# Altium integrated library Self made library.IntLib: 370 symbols (part 3 of 3)
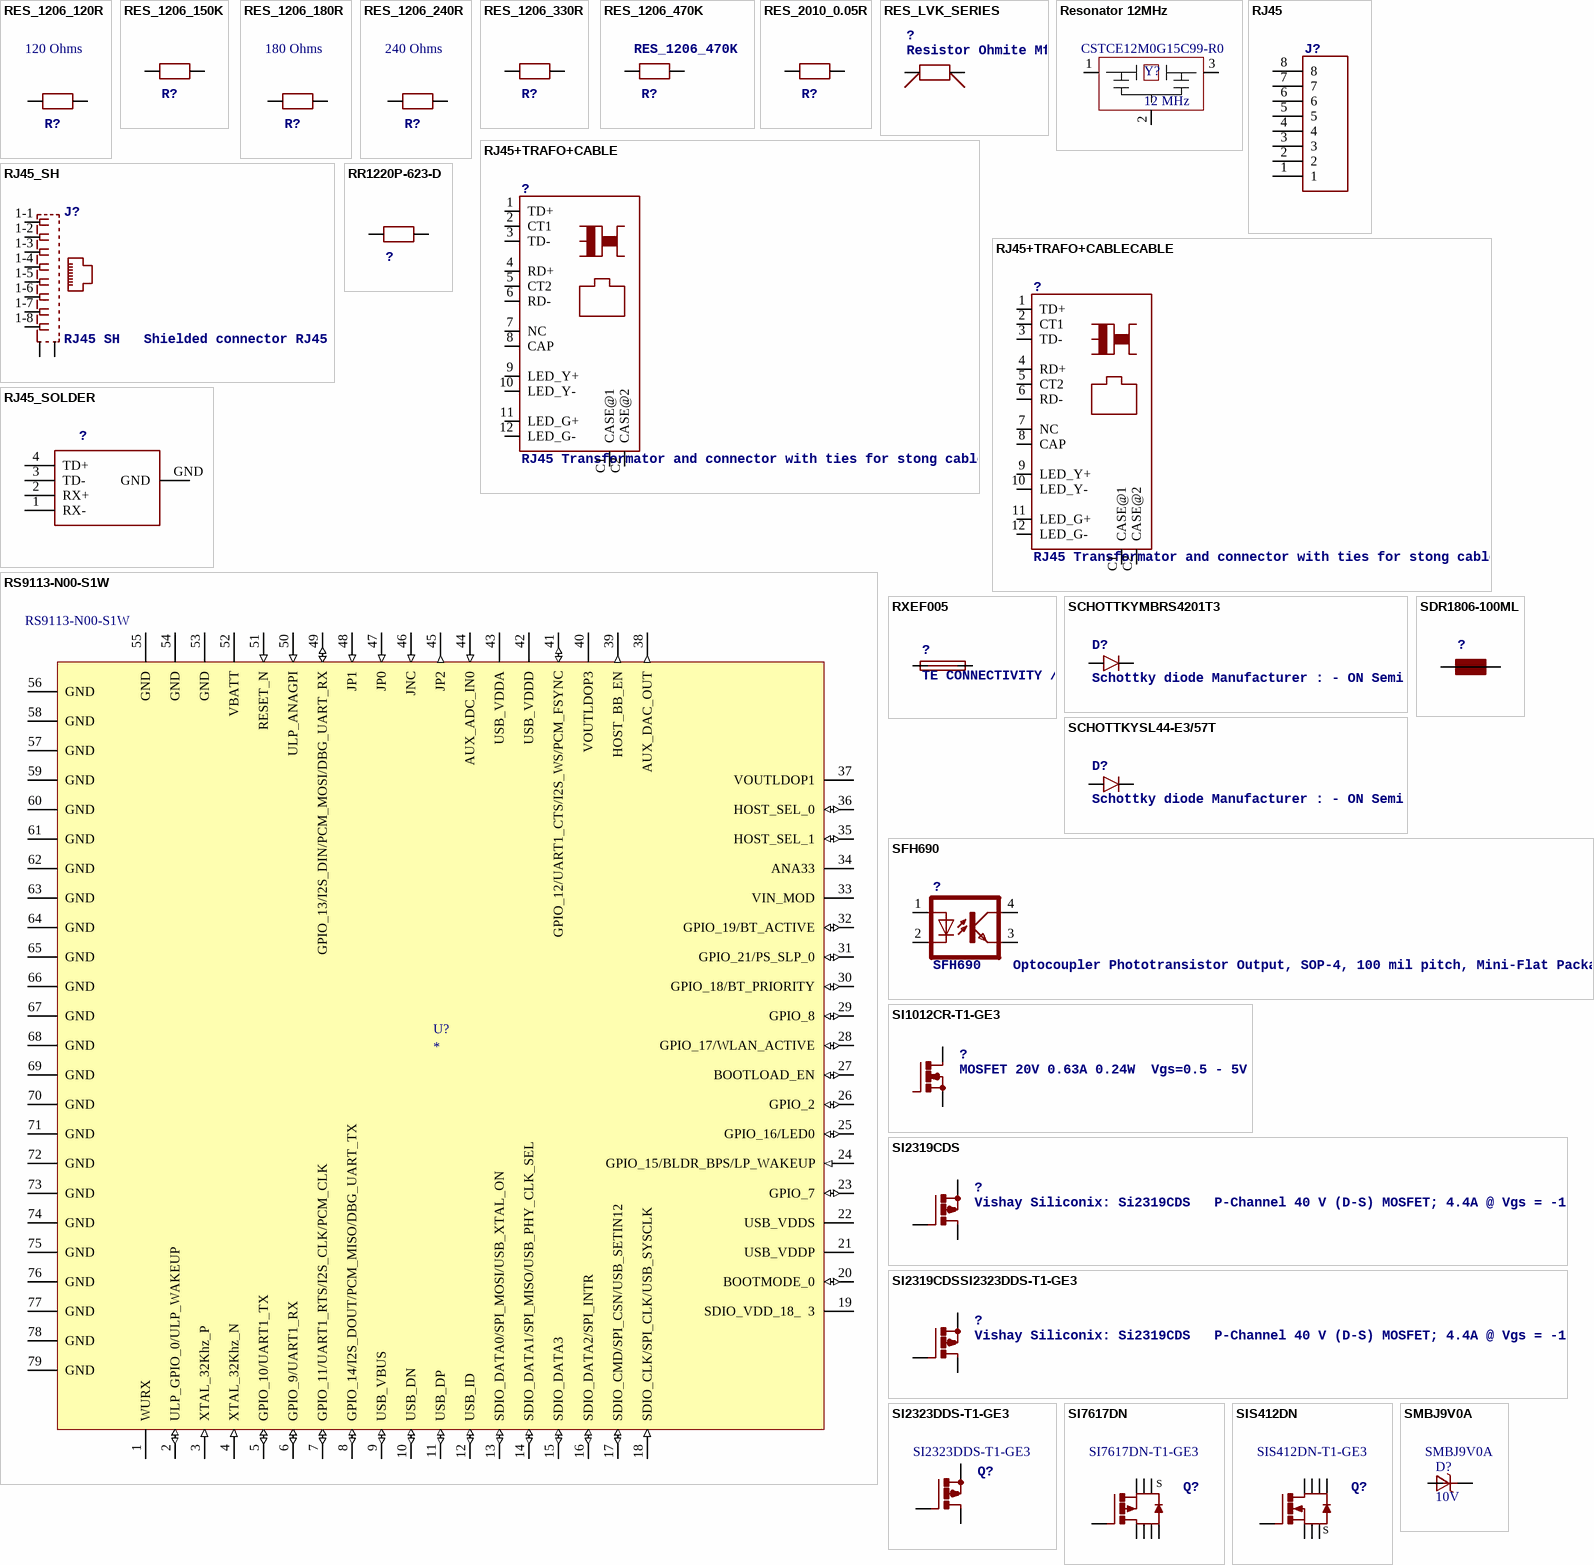
[diagram p22: symbols RES_1206_120R to SMBJ9V0A]

## Resonator 12MHz
designator Y?, comment 12 MHz  Manufacturer Part Number 1: CSTCE12M0G15C99-R0
Manufacturer 1: Murata Electronics; Description 1: Résonateurs 12MHZ; Capacité de charge: 33 pF; Plage de températures de fonctionnement: - 40 C to + 125 C; Conditionnement: Reel; Série: CST; Style du raccordement: SMD/SMT; Tolérance: 0.1 %; Fabricant: Murata; Catégorie du produit: Ceramic Resonators, SMD; Quantité standard du lot: 3000; Nom commercial: CERALOCK; Supplier 1: Mouser; Supplier Part Number 1: 81-CSTCE12M0G15C99R0; RoHS: RoHS Compliant; Category: Résonateurs; Stock 1: 1792; Pricing 1: 1=0.696, 10=0.468, 100=0.444, 1000=0.374, 3000=0.339, 24000=0.328 (CHF); Dimensions: 1.3 mm W x 3.2 mm L x 1.1 mm H; Fréquence: 12 MHz; Type: Small-cap Chip Type; Marque: Murata Electronics; RoHS - Mouser: Y; Minimum Order Quantity: 1; Reeling: True; ComponentLink1URL: http://www.mouser.com/ds/2/281/p16e-522700.pdf; ComponentLink1Description: http://www.mouser.com/ds/2/281/p16e-522700.pdf
footprint CSTCE_G15C
pins: 1, 2, 3

## RJ45
designator J?
footprint RJ45_AMP_215877
pins: 1, 2, 3, 4, 5, 6, 7, 8

## RJ45+TRAFO+CABLE
designator ?, comment RJ45 Transformator and connector with ties for stong cable
footprint RJ45_HPLE_WE
pins: 1 TD+, 2 CT1, 3 TD-, 4 RD+, 5 CT2, 6 RD-, 7 NC, 8 CAP, 9 LED_Y+, 10 LED_Y-, 11 LED_G+, 12 LED_G-, C1 CASE@1, C2 CASE@2

## RJ45+TRAFO+CABLECABLE
designator ?, comment RJ45 Transformator and connector with ties for stong cable
footprint RJ45_LAN_HPLE_WE
pins: 1 TD+, 2 CT1, 3 TD-, 4 RD+, 5 CT2, 6 RD-, 7 NC, 8 CAP, 9 LED_Y+, 10 LED_Y-, 11 LED_G+, 12 LED_G-, C1 CASE@1, C2 CASE@2

## RJ45_SH
designator J?, comment RJ45 SH   Shielded connector RJ45
footprint CON_RJ45_SH
pins: 1-1 1, 1-2 2, 1-3 3, 1-4 4, 1-5 5, 1-6 6, 1-7 7, 1-8 8, G1 S1, G2 S2

## RJ45_SOLDER
designator ?
footprint USB_SOLDER
pins: 1 RX-, 2 RX+, 3 TD-, 4 TD+, GND

## RR1220P-623-D
designator ?
footprint 0805
pins: 1, 2

## RS9113-N00-S1W
designator U?  Manufacturer Part Number 1: RS9113-N00-S1W
Manufacturer 1: Redpine Signals; Description 1: Modules WiFi / 802.11 1band WiSeConnect Mod w/Ant and Wi-Fi; Conditionnement: Tray; Série: WiSeConnect; Product Status: New Product; Supplier 1: Mouser; Supplier Part Number 1: 980-RS9113-N00-S1W; RoHS: RoHS Compliant; Category: Modules WiFi / 802.11; Stock 1: 11; Pricing 1: 1=53.94, 10=50.49, 25=49.33, 50=47.36, 100=27.47 (CHF); Marque: Redpine Signals; Fabricant: Redpine Signals; RoHS - Mouser: Y; Minimum Order Quantity: 1; Reeling: False; ComponentLink1URL: http://www.mouser.com/ds/2/469/RS9113- WiSeConnectTM Module Family-335092.pdf; ComponentLink1Description: http://www.mouser.com/ds/2/469/RS9113- WiSeConnectTM Module Family-335092.pdf
footprint RS9113-N00-S1W
pins: 1 WURX, 2 ULP_GPIO_0/ULP_WAKEUP (io), 3 XTAL_32Khz_P (in), 4 XTAL_32Khz_N (in), 5 GPIO_10/UART1_TX (io), 6 GPIO_9/UART1_RX (io), 7 GPIO_11/UART1_RTS/I2S_CLK/PCM_CLK (io), 8 GPIO_14/I2S_DOUT/PCM_MISO/DBG_UART_TX (io), 9 USB_VBUS (io), 10 USB_DN (io), 11 USB_DP (io), 12 USB_ID (io), 13 SDIO_DATA0/SPI_MOSI/USB_XTAL_ON (io), 14 SDIO_DATA1/SPI_MISO/USB_PHY_CLK_SEL (io), 15 SDIO_DATA3 (io), 16 SDIO_DATA2/SPI_INTR (io), 17 SDIO_CMD/SPI_CSN/USB_SETIN12 (io), 18 SDIO_CLK/SPI_CLK/USB_SYSCLK (in), 19 SDIO_VDD_18_  3 (power), 20 BOOTMODE_0 (io), 21 USB_VDDP (power), 22 USB_VDDS (power), 23 GPIO_7 (io), 24 GPIO_15/BLDR_BPS/LP_WAKEUP (in), 25 GPIO_16/LED0 (io), 26 GPIO_2 (io), 27 BOOTLOAD_EN (io), 28 GPIO_17/WLAN_ACTIVE (io), 29 GPIO_8 (io), 30 GPIO_18/BT_PRIORITY (io), 31 GPIO_21/PS_SLP_0 (io), 32 GPIO_19/BT_ACTIVE (io), 33 VIN_MOD (power), 34 ANA33 (power), 35 HOST_SEL_1 (io), 36 HOST_SEL_0 (io), 37 VOUTLDOP1 (power), 38 AUX_DAC_OUT (out), 39 HOST_BB_EN (out), 40 VOUTLDOP3 (power), 41 GPIO_12/UART1_CTS/I2S_WS/PCM_FSYNC (io), 42 USB_VDDD (power), 43 USB_VDDA (power), 44 AUX_ADC_IN0 (in), 45 JP2 (out), 46 JNC (in), 47 JP0 (in), 48 JP1 (in), 49 GPIO_13/I2S_DIN/PCM_MOSI/DBG_UART_RX (io), 50 ULP_ANAGPI (in), 51 RESET_N (in), 52 VBATT (power), 53 GND (power), 54 GND (power), 55 GND (power), 56 GND (power), 57 GND (power), 58 GND (power), 59 GND (power), 60 GND (power), 61 GND (power), 62 GND (power), 63 GND (power), 64 GND (power), 65 GND (power), 66 GND (power), 67 GND (power), 68 GND (power), 69 GND (power), 70 GND (power), 71 GND (power), 72 GND (power), 73 GND (power), 74 GND (power), 75 GND (power), 76 GND (power), 77 GND (power), 78 GND (power), 79 GND (power)

## RXEF005
designator ?, comment TE CONNECTIVITY / RAYCHEM - RXEF005   Courant de maintien: 0.05A   Courant, déclenchement: 0.10A    Tension de fonctionnement: 60V
footprint RXEF_FIG5
pins: 1, 2

## SCHOTTKYMBRS4201T3
designator D?, comment Schottky diode Manufacturer : - ON Semi
footprint SMC_403-3
pins: A, C

## SCHOTTKYSL44-E3/57T
designator D?, comment Schottky diode Manufacturer : - ON Semi
footprint DO-214AB
pins: A, C

## SDR1806-100ML
designator ?
footprint SDR1806
pins: P$2 1, P$3 2

## SFH690
designator ?, comment SFH690    Optocoupler Phototransistor Output, SOP-4, 100 mil pitch, Mini-Flat Package
MANUFACTURER: Vishay Semiconductors; MANUFACTURER_PART_NUMBER: SFH690BT; UNIT_PRICE: 0.755; SUPPLIER: mouser; SUPPLIER_PART_NUMBER: 782-SFH690BT
footprint SOP04
pins: 1 A, 2 C, 3 EMIT, 4 COL

## SI1012CR-T1-GE3
designator ?, comment MOSFET 20V 0.63A 0.24W  Vgs=0.5 - 5V
MANUFACTURER: Vishay; MANUFACTURER_PART_NUMBER: SI1012CR-T1-GE3; UNIT_PRICE: 0.5; SUPPLIER: Mouser; SUPPLIER_PART_NUMBER: 78-SI1012CR-T1-GE3
footprint SOT-523-3
pins: 1 G, 2 S, 3 D

## SI2319CDS
designator ?, comment Vishay Siliconix: Si2319CDS   P-Channel 40 V (D-S) MOSFET; 4.4A @ Vgs = -10V
footprint SOT23
pins: 1 G, 2 S, 3 D

## SI2319CDSSI2323DDS-T1-GE3
designator ?, comment Vishay Siliconix: Si2319CDS   P-Channel 40 V (D-S) MOSFET; 4.4A @ Vgs = -10V
footprint SOT23
pins: 1 G, 2 S, 3 D

## SI2323DDS-T1-GE3
designator Q?, comment Manufacturer Part Number 1: SI2323DDS-T1-GE3  (hidden comment: MOSFET -20V 39mOhm@4.5V -5.3A P-Ch G-III)
MANUFACTURER: Vishay; Manufacturer 1: Vishay Semiconductors; UNIT_PRICE: 0.6; Configuration: Single; Package/Boîte: SOT-23-3; Conditionnement: Reel; Série: SI2323DDS; Transconductance directe - min.: 18 S; Style de montage: SMD/SMT; Polarité du transistor: P-Channel; Mode canal: Enhancement; Ciss - Capacité d'entrée: 1.16 nF; Temps de descente: 11 ns; Température de fonctionnement max.: + 150 C; Température de fonctionnement min.: - 55 C; Pd - Dissipation d’énergie: 1.7 W; Catégorie du produit: P-Channel MOSFETs; Qg - Charge de grille: 13.6 nC; Rds On - Résistance drain-source: 39 mOhms; Temps de montée: 22 ns; Quantité standard du lot: 3000; Nom commercial: TrenchFET  Power MOSFET; Délai de désactivation type: 52 ns; Vgs - Tension de rupture grille-source: 8 V; Vgs th - Tension de seuil grille-source: - 1 V; MANUFACTURER_PART_NUMBER: SI2323DDS-T1-GE3; SUPPLIER: Mouser; SUPPLIER_PART_NUMBER: 78-SI2323DDS-T1-GE3; Supplier 1: Mouser; Supplier Part Number 1: 78-SI2323DDS-T1-GE3; RoHS: RoHS Compliant; Description 1: MOSFET -20V 39mOhm@4.5V -5.3A P-Ch G-III; Category: MOSFET; Stock 1: 1212; Pricing 1: 1=0.570, 10=0.424, 100=0.315, 500=0.267, 1000=0.206, 3000=0.188, 6000=0.175, 9000=0.164, 24000=0.158 (CHF); Marque: Vishay Semiconductors; Id - Courant continu de fuite: - 5.3 A; Fabricant: Vishay; Vds - Tension de rupture drain-source: - 20 V; RoHS - Mouser: Y; Minimum Order Quantity: 1; Reeling: True; ComponentLink1URL: http://www.mouser.com/ds/2/427/si2323dds-254119.pdf; ComponentLink1Description: http://www.mouser.com/ds/2/427/si2323dds-254119.pdf
footprint SOT23
pins: 1 G, 2 S, 3 D

## SI7617DN
designator Q?  Manufacturer Part Number: SI7617DN-T1-GE3
Manufacturer: Vishay Semiconductors; Configuration: Single; Forward Transconductance - Min: 35 S; Transistor Polarity: P-Channel; Channel Mode: Enhancement; Fall Time: 11 ns; Id - Continuous Drain Current: - 35 A; Pd - Power Dissipation: 52 W; Qg - Gate Charge: 20.5 nC; Rds On - Drain-Source Resistance: 12.3 mOhms; Rise Time: 43 ns; Typical Turn-Off Delay Time: 30 ns; Vds - Drain-Source Breakdown Voltage: - 30 V; Vgs - Gate-Source Breakdown Voltage: 25 V; Supplier 1: Mouser; RoHS: RoHS Compliant By Exemption; Category: MOSFET; Stock 1: 18173; Pricing 1: 1=0.845, 10=0.678, 100=0.521, 500=0.461, 1000=0.363, 3000=0.339, 6000=0.328 (CHF); Package/Case: PowerPAK-1212-8; Packaging: Reel; Brand: Vishay Semiconductors; Mounting Style: SMD/SMT; Maximum Operating Temperature: + 150 C; Minimum Operating Temperature: - 55 C; Product Category: P-Channel MOSFETs; Standard Pack Qty: 3000; RoHS - Mouser: E; Minimum Order Quantity: 1; Reeling: True; ComponentLink1URL: http://www.mouser.com/ds/2/427/si7617dn-244516.pdf; ComponentLink1Description: http://www.mouser.com/ds/2/427/si7617dn-244516.pdf; Supplier Part Number 1: 781-SI7617DN-GE3
footprint PowerPAK 1212-8
pins: 1 S, 2 S, 3 S, 4 G, 5 D, 6 D, 7 D, 8 D

## SIS412DN
designator Q?  Manufacturer Part Number: SIS412DN-T1-GE3
Manufacturer: Vishay Semiconductors; Configuration: Single Quad Drain Triple Source; Forward Transconductance - Min: 17 S; Transistor Polarity: N-Channel; Channel Mode: Enhancement; Fall Time: 10 ns; Id - Continuous Drain Current: 12 A; Pd - Power Dissipation: 3.2 W; Rds On - Drain-Source Resistance: 24 mOhms; Rise Time: 12 ns; Typical Turn-Off Delay Time: 15 ns; Vds - Drain-Source Breakdown Voltage: 30 V; Vgs - Gate-Source Breakdown Voltage: 20 V; Product Status: New Technology; Supplier 1: Mouser; RoHS: RoHS Compliant; Category: MOSFET; Stock 1: 13270; Pricing 1: 1=0.561, 10=0.442, 100=0.335, 500=0.286, 1000=0.270, 3000=0.270 (CHF); Package/Case: PowerPAK-1212-8; Packaging: Reel; Series: SISxxxDN; Brand: Vishay Semiconductors; Mounting Style: SMD/SMT; Maximum Operating Temperature: + 150 C; Minimum Operating Temperature: - 55 C; Product Category: N-Channel MOSFETs; Standard Pack Qty: 3000; RoHS - Mouser: Y; Minimum Order Quantity: 1; Reeling: True; ComponentLink1URL: http://www.mouser.com/ds/2/427/sis412dn-280002.pdf; ComponentLink1Description: http://www.mouser.com/ds/2/427/sis412dn-280002.pdf; Supplier Part Number 1: 781-SIS412DN-T1-GE3
footprint PowerPAK 1212-8
pins: 1 S, 2 S, 3 S, 4 G, 5 D, 6 D, 7 D, 8 D

## SMBJ9V0A
designator D?, comment 10V  Manufacturer Part Number 1: SMBJ9V0A
Diodes TVS - Parasurtenseurs 9V 600W SMB Unidirectional; Manufacturer 1: Fairchild Semiconductor; Tension de rupture: 10 V to 11.1 V; Blocage de la tension: 15.4 V; Package/Boîte: DO-214AA; Conditionnement: Reel; Série: SMBJ9; Style du raccordement: SMD/SMT; Courant de surtension de pointe: 39 A; Température de fonctionnement max.: + 150 C; Température de fonctionnement min.: - 55 C; Quantité standard du lot: 3000; Supplier 1: Mouser; Supplier Part Number 1: 512-SMBJ9V0A; RoHS: RoHS Compliant By Exemption; Description 1: Diodes TVS - Parasurtenseurs 9V 600W SMB Unidirectional; Category: Diodes TVS - Parasurtenseurs; Stock 1: 4884; Pricing 1: 1=0.438, 10=0.293, 100=0.163, 1000=0.122, 3000=0.103, 9000=0.095, 24000=0.087, 45000=0.085 (CHF); Dimensions: 3.95(Max) mm W x 4.75 mm L; Tension de fonctionnement: 9 V; Marque: Fairchild Semiconductor; Style de montage: SMD/SMT; Fabricant: Fairchild Semiconductor; Dissipation de la puissance d'impulsion de crête: 600 W; Polarité: Unidirectional; RoHS - Mouser: E; Minimum Order Quantity: 1; Reeling: True; ComponentLink1URL: http://www.mouser.com/ds/2/149/SMBJ9V0A-196751.pdf; ComponentLink1Description: http://www.mouser.com/ds/2/149/SMBJ9V0A-196751.pdf
footprint DIODE_UNIDIR_SMB
pins: A, C

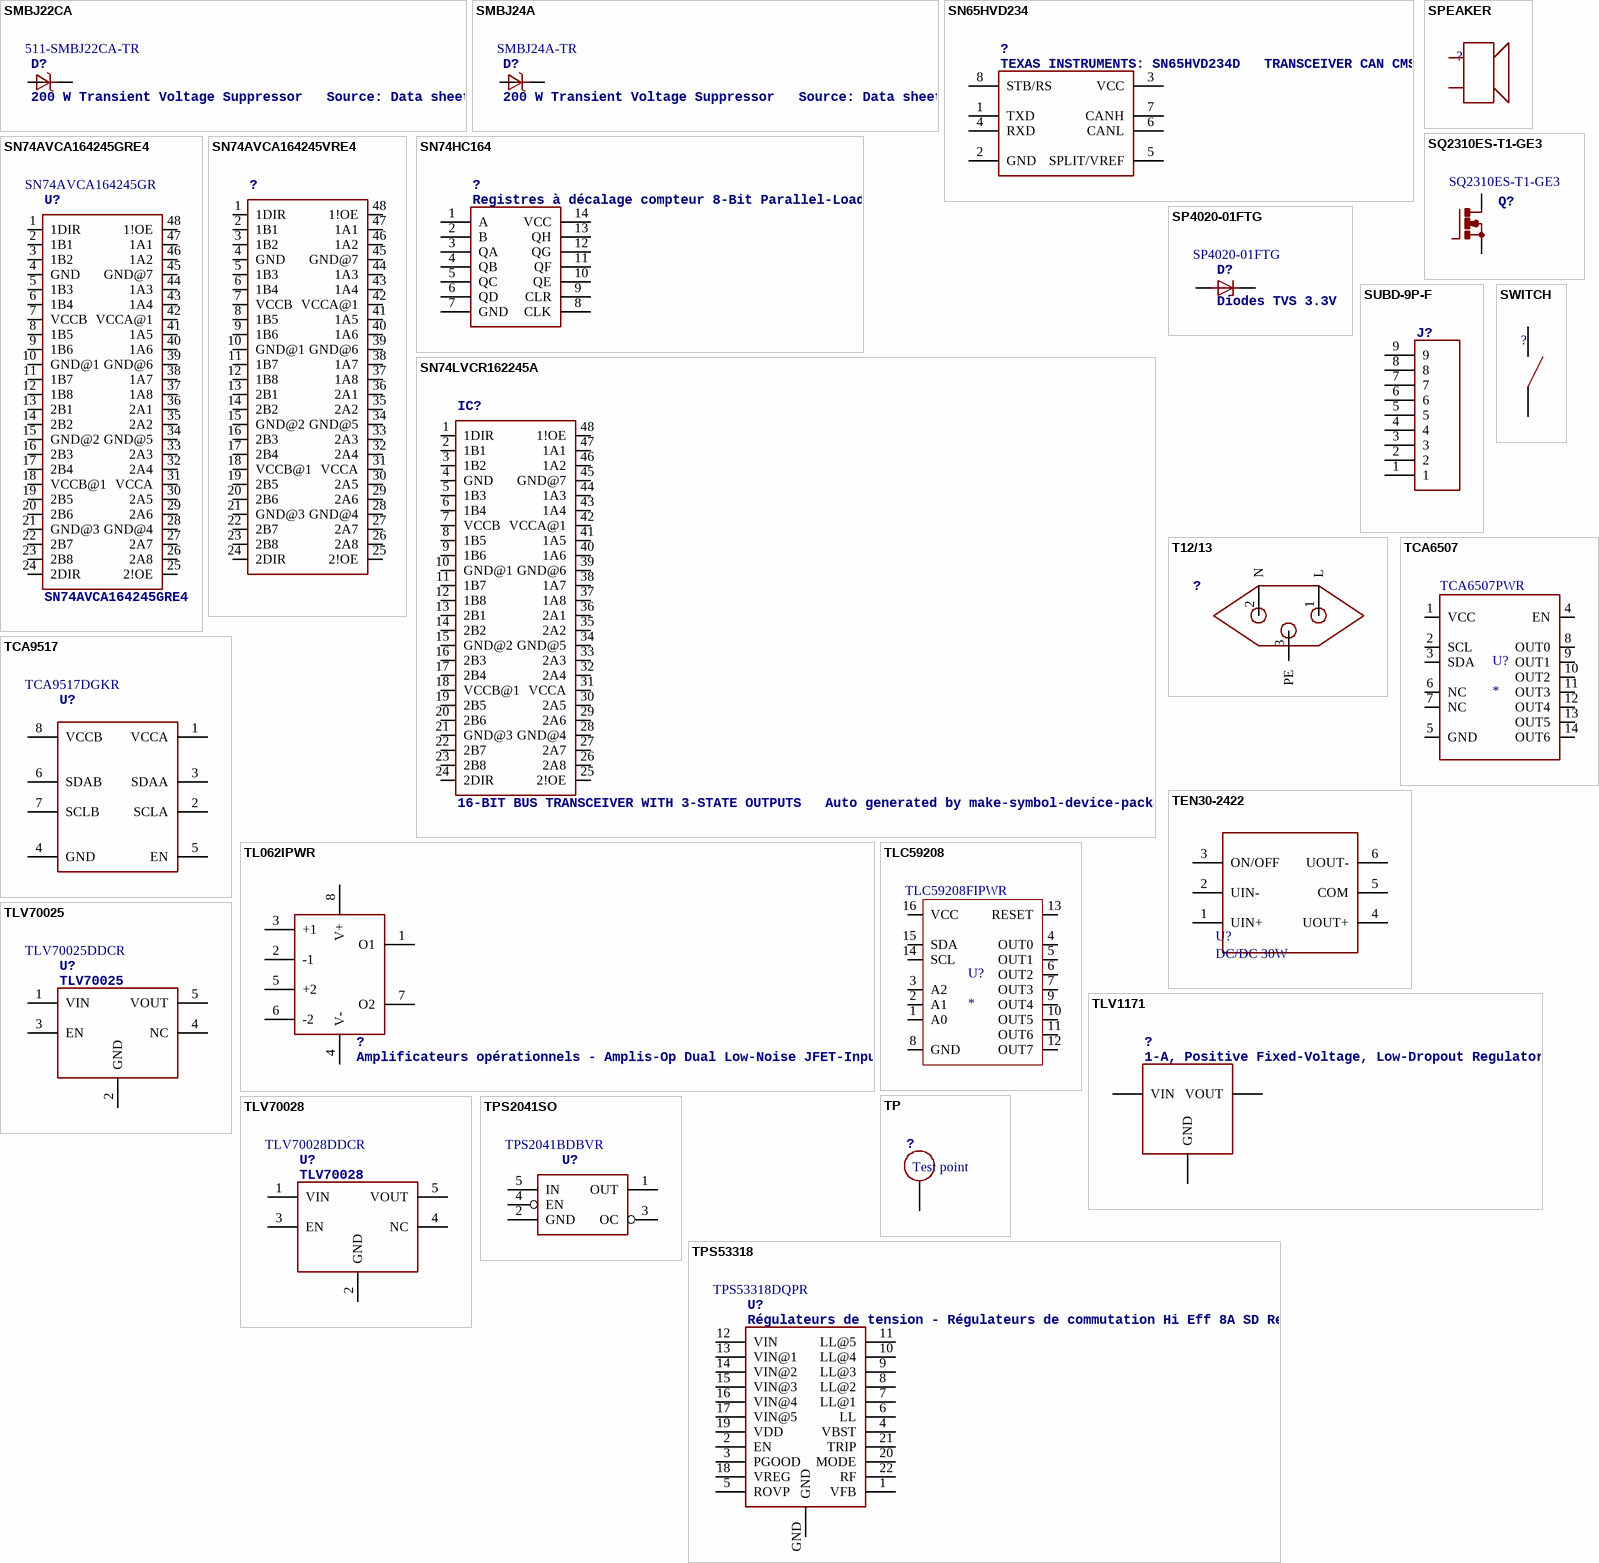
[diagram p17: symbols SMBJ22CA to TPS53318]

## SMBJ22CA
designator D?, comment 200 W Transient Voltage Suppressor   Source: Data sheet  Supplier Part Number 1: 511-SMBJ22CA-TR
Manufacturer: STMicroelectronics; Manufacturer Part Number: SMBJ22CA-TR; Description: TVS Diodes - Transient Voltage Suppressors TRANSIL PROTECTION; Breakdown Voltage: 24.4 V; Clamping Voltage: 48.3 V; Peak Surge Current: 17.7 A; Operating Supply Voltage: 22 V; Pd - Power Dissipation: 600 W; Polarity: Bidirectional; Supplier 1: Mouser; RoHS: RoHS Compliant; Category: TVS Diodes - Transient Voltage Suppressors; Stock 1: 2944; Pricing 1: 1=0.237, 10=0.163, 100=0.107, 1000=0.083, 2500=0.070, 10000=0.067, 25000=0.065 (CHF); Dimensions: 3.95 mm W x 4.6 mm L x 2.45 mm H; Package/Case: DO-214AA; Packaging: Reel; Series: SMBJ22; Termination Style: SMD/SMT; Brand: STMicroelectronics; Mounting Style: SMD/SMT; Maximum Operating Temperature: + 150 C; Minimum Operating Temperature: - 55 C; Product Category: Voltage Protection Devices; Standard Pack Qty: 2500; Tradename: Transil; RoHS - Mouser: Y; Minimum Order Quantity: 1; Reeling: True; ComponentLink1URL: http://www.mouser.com/ds/2/389/CD00001366-310691.pdf; ComponentLink1Description: http://www.mouser.com/ds/2/389/CD00001366-310691.pdf
footprint DIODE_UNIDIR_SMB
pins: A, C

## SMBJ24A
designator D?, comment 200 W Transient Voltage Suppressor   Source: Data sheet  Manufacturer Part Number 1: SMBJ24A-TR
Manufacturer 1: STMicroelectronics; Description 1: Diodes TVS - Parasurtenseurs 600W 24V Unidirect; Tension de rupture: 26.7 V to 29.5 V; Capacité électrique: 1112 pF; Blocage de la tension: 50 V; Tension de fonctionnement: 24 V; Package/Boîte: DO-214AA; Conditionnement: Reel; Série: SMBJ24; Style du raccordement: SMD/SMT; Courant de surtension de pointe: 16 A; Température de fonctionnement max.: + 150 C; Température de fonctionnement min.: - 55 C; Dissipation de la puissance d'impulsion de crête: 600 W; Polarité: Unidirectional; Catégorie du produit: Voltage Protection Devices; Quantité standard du lot: 2500; Nom commercial: Transil; Supplier 1: Mouser; Supplier Part Number 1: 511-SMBJ24A; RoHS: RoHS Compliant; Category: Diodes TVS - Parasurtenseurs; Stock 1: 0; Pricing 1: 1=0.228, 10=0.154, 100=0.102, 1000=0.079, 2500=0.066, 10000=0.064, 25000=0.062 (CHF); Dimensions: 3.95 mm W x 4.6 mm L x 2.45 mm H; Marque: STMicroelectronics; Style de montage: SMD/SMT; Fabricant: STMicroelectronics; RoHS - Mouser: Y; Minimum Order Quantity: 1; Reeling: True; ComponentLink1URL: http://www.mouser.com/ds/2/389/CD00001366-310691.pdf; ComponentLink1Description: http://www.mouser.com/ds/2/389/CD00001366-310691.pdf
footprint DIODE_UNIDIR_SMB
pins: A, C

## SN65HVD234
designator ?, comment TEXAS INSTRUMENTS: SN65HVD234D   TRANSCEIVER CAN CMS
footprint SOIC8
pins: 1 TXD, 2 GND, 3 VCC, 4 RXD, 5 SPLIT/VREF, 6 CANL, 7 CANH, 8 STB/RS

## SN74AVCA164245GRE4
designator U?  Manufacturer Part Number 1: SN74AVCA164245GR
MANUFACTURER: Texas Instruments; UNIT_PRICE: 4.01; Description 1: Translation - Niveaux de tension 16-Bit Dual-Supply Bus Xcvr; Débit de données: 400 Mb/s; Type de sortie: 3-State; Package/Boîte: TSSOP-48; Conditionnement: Reel; Style de montage: SMD/SMT; Température de fonctionnement max.: + 85 C; Température de fonctionnement min.: - 40 C; Catégorie du produit: Logic - Voltage Level Translation; Délai de propagation: 2.4 ns; Quantité standard du lot: 2000; Tension d’alimentation - Max.: 3.6 V; Tension d’alimentation - Min.: 1.4 V; MANUFACTURER_PART_NUMBER: SN74AVCA164245GR; SUPPLIER: Mouser; SUPPLIER_PART_NUMBER: 595-SN74AVCA164245GR; Supplier 1: Mouser; Supplier Part Number 1: 595-SN74AVCA164245GR; Manufacturer 1: Texas Instruments; RoHS: RoHS Compliant; Category: Translation - Niveaux de tension; Stock 1: 4102; Pricing 1: 1=3.99, 10=3.20, 100=2.92, 250=2.64, 500=2.13, 1000=2.00, 2000=1.85, 4000=1.83 (CHF); Série: SN74AVCA164245; Marque: Texas Instruments; Fabricant: Texas Instruments; RoHS - Mouser: Y; Minimum Order Quantity: 1; Reeling: True; ComponentLink1URL: http://www.mouser.com/ds/2/405/sn74avca164245-407730.pdf; ComponentLink1Description: http://www.mouser.com/ds/2/405/sn74avca164245-407730.pdf
footprint TSSOP48
pins: 1 1DIR, 2 1B1 (hiz), 3 1B2 (hiz), 4 GND (power), 5 1B3 (hiz), 6 1B4 (hiz), 7 VCCB (power), 8 1B5 (hiz), 9 1B6 (hiz), 10 GND@1 (power), 11 1B7 (hiz), 12 1B8 (hiz), 13 2B1 (hiz), 14 2B2 (hiz), 15 GND@2 (power), 16 2B3 (hiz), 17 2B4 (hiz), 18 VCCB@1 (power), 19 2B5 (hiz), 20 2B6 (hiz), 21 GND@3 (hiz), 22 2B7 (hiz), 23 2B8 (hiz), 24 2DIR, 25 2!OE, 26 2A8 (hiz), 27 2A7 (hiz), 28 GND@4 (power), 29 2A6 (hiz), 30 2A5 (hiz), 31 VCCA (power), 32 2A4 (hiz), 33 2A3 (hiz), 34 GND@5 (power), 35 2A2 (hiz), 36 2A1 (hiz), 37 1A8 (hiz), 38 1A7 (hiz), 39 GND@6 (hiz), 40 1A6 (hiz), 41 1A5 (hiz), 42 VCCA@1 (power), 43 1A4 (hiz), 44 1A3 (hiz), 45 GND@7 (power), 46 1A2 (hiz), 47 1A1 (hiz), 48 1!OE

## SN74AVCA164245VRE4
designator ?
MANUFACTURER: Texas Instruments; MANUFACTURER_PART_NUMBER: SN74AVCA164245VR; UNIT_PRICE: 4.40; SUPPLIER: Mouser; SUPPLIER_PART_NUMBER: 595-SN74AVCA164245VR
footprint TVSOP48
pins: 1 1DIR, 2 1B1 (hiz), 3 1B2 (hiz), 4 GND (power), 5 1B3 (hiz), 6 1B4 (hiz), 7 VCCB (power), 8 1B5 (hiz), 9 1B6 (hiz), 10 GND@1 (power), 11 1B7 (hiz), 12 1B8 (hiz), 13 2B1 (hiz), 14 2B2 (hiz), 15 GND@2 (power), 16 2B3 (hiz), 17 2B4 (hiz), 18 VCCB@1 (power), 19 2B5 (hiz), 20 2B6 (hiz), 21 GND@3 (hiz), 22 2B7 (hiz), 23 2B8 (hiz), 24 2DIR, 25 2!OE, 26 2A8 (hiz), 27 2A7 (hiz), 28 GND@4 (power), 29 2A6 (hiz), 30 2A5 (hiz), 31 VCCA (power), 32 2A4 (hiz), 33 2A3 (hiz), 34 GND@5 (power), 35 2A2 (hiz), 36 2A1 (hiz), 37 1A8 (hiz), 38 1A7 (hiz), 39 GND@6 (hiz), 40 1A6 (hiz), 41 1A5 (hiz), 42 VCCA@1 (power), 43 1A4 (hiz), 44 1A3 (hiz), 45 GND@7 (power), 46 1A2 (hiz), 47 1A1 (hiz), 48 1!OE

## SN74HC164
designator ?, comment Registres à décalage compteur 8-Bit Parallel-Load
MANUFACTURER: Texas Instruments; MANUFACTURER_PART_NUMBER: SN74HC164PWR; UNIT_PRICE: 0.46; SUPPLIER: Mouser; SUPPLIER_PART_NUMBER: 595-SN74HC164PWR
footprint R-PDSO-G14
pins: 1 A, 2 B, 3 QA, 4 QB, 5 QC, 6 QD, 7 GND, 8 CLK, 9 CLR, 10 QE, 11 QF, 12 QG, 13 QH, 14 VCC

## SN74LVCR162245A
designator IC?, comment 16-BIT BUS TRANSCEIVER WITH 3-STATE OUTPUTS   Auto generated by make-symbol-device-package-bsdl.ulp Rev. 33 Source: http://focus.ti.com/lit/ds/symlink/sn74lvcr162245.pdf
MPN: SN74LVCR162245DL; OC_FARNELL: 1739707; OC_NEWARK: 50R6613
footprint DL_R-PDSO-G48
pins: 1 1DIR, 2 1B1 (hiz), 3 1B2 (hiz), 4 GND (power), 5 1B3 (hiz), 6 1B4 (hiz), 7 VCCB (power), 8 1B5 (hiz), 9 1B6 (hiz), 10 GND@1 (power), 11 1B7 (hiz), 12 1B8 (hiz), 13 2B1 (hiz), 14 2B2 (hiz), 15 GND@2 (power), 16 2B3 (hiz), 17 2B4 (hiz), 18 VCCB@1 (power), 19 2B5 (hiz), 20 2B6 (hiz), 21 GND@3 (hiz), 22 2B7 (hiz), 23 2B8 (hiz), 24 2DIR, 25 2!OE, 26 2A8 (hiz), 27 2A7 (hiz), 28 GND@4 (power), 29 2A6 (hiz), 30 2A5 (hiz), 31 VCCA (power), 32 2A4 (hiz), 33 2A3 (hiz), 34 GND@5 (power), 35 2A2 (hiz), 36 2A1 (hiz), 37 1A8 (hiz), 38 1A7 (hiz), 39 GND@6 (hiz), 40 1A6 (hiz), 41 1A5 (hiz), 42 VCCA@1 (power), 43 1A4 (hiz), 44 1A3 (hiz), 45 GND@7 (power), 46 1A2 (hiz), 47 1A1 (hiz), 48 1!OE

## SP4020-01FTG
designator D?, comment Diodes TVS 3.3V  Manufacturer Part Number 1: SP4020-01FTG
MANUFACTURER: Littelfuse; UNIT_PRICE: 0.8; Description 1: Barrettes de diodes TVS 2.5pF 30A for Surge Protection; Tension de rupture: 3.5 V; Capacité électrique: 2.5 pF; Blocage de la tension: 21.8 V; Package/Boîte: SOD-323; Conditionnement: Reel; Série: SP4021; Style du raccordement: SMD/SMT; Canaux: 1 Channel; Courant de surtension de pointe: 30 A; Hauteur du boîtier: 0.9 mm; Température de fonctionnement max.: + 125 C; Température de fonctionnement min.: - 40 C; Dissipation de la puissance d'impulsion de crête: 750 W; Polarité: Unidirectional; Catégorie du produit: TVS SCR/Diode Arrays; Quantité standard du lot: 3000; Nom commercial: SPA; Product Status: New Product; MANUFACTURER_PART_NUMBER: SP4020-01FTG; SUPPLIER: Mouser; SUPPLIER_PART_NUMBER: 576-SP4020-01FTG; Supplier 1: Mouser; Supplier Part Number 1: 576-SP4020-01FTG; Manufacturer 1: Littelfuse; RoHS: RoHS Compliant; Category: Barrettes de diodes TVS; Stock 1: 5627; Pricing 1: 1=0.796, 10=0.616, 100=0.398, 1000=0.318, 3000=0.269, 9000=0.258, 24000=0.249, 45000=0.245 (CHF); Dimensions: 1.4 mm W x 2.7 mm L x 1 mm H; Tension de fonctionnement: 3.3 V; Marque: Littelfuse; Style de montage: SMD/SMT; Fabricant: Littelfuse; RoHS - Mouser: Y; Minimum Order Quantity: 1; Reeling: True; ComponentLink1URL: http://www.mouser.com/ds/2/240/Littelfuse-SP4020-267385.pdf; ComponentLink1Description: http://www.mouser.com/ds/2/240/Littelfuse-SP4020-267385.pdf
footprint SOD323
pins: 1, 2

## SPEAKER
designator ?
footprint HEADER_2

## SQ2310ES-T1-GE3
designator Q?, comment Manufacturer Part Number 1: SQ2310ES-T1-GE3  (hidden comment: MOSFET N 20V 6A 2W  Vgs = 1 - 5 V)
MANUFACTURER: Vishay; Manufacturer 1: Vishay Semiconductors; UNIT_PRICE: 0.7; Description 1: MOSFET 20V 6A 2W; Configuration: Single; Package/Boîte: SOT-23-3; Conditionnement: Reel; Transconductance directe - min.: 27 S; Style de montage: SMD/SMT; Polarité du transistor: N-Channel; Temps de descente: 9 ns; Température de fonctionnement max.: + 175 C; Température de fonctionnement min.: - 55 C; Catégorie du produit: N-Channel MOSFETs; Qg - Charge de grille: 4.5 nC; Rds On - Résistance drain-source: 30 mOhms; Temps de montée: 8 ns; Quantité standard du lot: 3000; Nom commercial: TrenchFET SQ Rugged Series; Délai de désactivation type: 21 ns; Vgs th - Tension de seuil grille-source: 0.6 V; MANUFACTURER_PART_NUMBER: SQ2310ES-T1-GE3; SUPPLIER: Mouser; SUPPLIER_PART_NUMBER: 78-SQ2310ES-T1-GE3; Supplier 1: Mouser; Supplier Part Number 1: 78-SQ2310ES-T1-GE3; RoHS: RoHS Compliant; Category: MOSFET; Stock 1: 3198; Pricing 1: 1=0.713, 10=0.557, 100=0.422, 500=0.359, 1000=0.287, 3000=0.260, 6000=0.243, 9000=0.234, 24000=0.231 (CHF); Marque: Vishay Semiconductors; Id - Courant continu de fuite: 6 A; Fabricant: Vishay; Pd - Dissipation d’énergie: 2 W; Vds - Tension de rupture drain-source: 20 V; RoHS - Mouser: Y; Minimum Order Quantity: 1; Reeling: True; ComponentLink1URL: http://www.mouser.com/ds/2/427/sq2310es-244414.pdf; ComponentLink1Description: http://www.mouser.com/ds/2/427/sq2310es-244414.pdf
footprint SOT23
pins: 1 G, 2 S, 3 D

## SUBD-9P-F
designator J?
footprint TYCO_TDE_SUBD_9P
pins: 1, 2, 3, 4, 5, 6, 7, 8, 9

## SWITCH
designator ?
footprint HEADER_2
pins: 1 P$1, 2 P$2

## T12/13
designator ?
footprint D2PACK
pins: 1 L, 2 N, 3 PE

## TCA6507
designator U?  Manufacturer Part Number: TCA6507PWR
Manufacturer: Texas Instruments; Input Voltage: 1.65 V to 3.6 V; Number of Outputs: 7 Output; Operating Frequency: 400 kHz; Output Current: 40 mA; Output Type: Open Drain; Topology: Boost; Maximum Supply Current: 25 uA; Supplier 1: Mouser; RoHS: RoHS Compliant; Category: LED Lighting Drivers; Stock 1: 2319; Pricing 1: 1=1.85, 10=1.47, 100=1.18, 500=0.932, 1000=0.856, 2000=0.781, 4000=0.765, 10000=0.754 (CHF); Package/Case: TSSOP-14; Packaging: Reel; Series: TCA6507; Type: LED Driver; Brand: Texas Instruments; Mounting Style: SMD/SMT; Low Level Output Current: 40 mA; Maximum Operating Temperature: + 85 C; Minimum Operating Temperature: - 40 C; Product Category: Logic - I2C; Standard Pack Qty: 2000; RoHS - Mouser: Y; Minimum Order Quantity: 1; Reeling: True; ComponentLink1URL: http://www.mouser.com/ds/2/405/tca6507-446657.pdf; ComponentLink1Description: http://www.mouser.com/ds/2/405/tca6507-446657.pdf; Supplier Part Number 1: 595-TCA6507PWR
footprint R-PDSO-G14
pins: 1 VCC, 2 SCL, 3 SDA, 4 EN, 5 GND, 6 NC, 7 NC, 8 OUT0, 9 OUT1, 10 OUT2, 11 OUT3, 12 OUT4, 13 OUT5, 14 OUT6

## TCA9517
designator U?, comment Manufacturer Part Number 1: TCA9517DGKR  (hidden comment: LEVEL-TRANSLATING I2C BUS REPEATER)
MANUFACTURER: Texas Instruments; UNIT_PRICE: 1.71; Description 1: Interface - Tampons de signal, répéteurs Level-Translating I2C Bus Repeater; Plage de températures de fonctionnement: - 40 C to + 85 C; Package/Boîte: VSSOP-8; Conditionnement: Reel; Série: TCA9517; Style de montage: SMD/SMT; Fréquence de l'horloge max.: 400 kHz; Tension d'alimentation de fonctionnement: 900 mV to 5.5 V; Délai de propagation: 141 ns; Quantité standard du lot: 2500; MANUFACTURER_PART_NUMBER: TCA9517DGKR; SUPPLIER: mouser; SUPPLIER_PART_NUMBER: 595-TCA9517DGKR; Supplier 1: Mouser; Supplier Part Number 1: 595-TCA9517DGKR; Manufacturer 1: Texas Instruments; RoHS: RoHS Compliant; Category: Interface - Tampons de signal, répéteurs; Stock 1: 6163; Pricing 1: 1=1.54, 10=1.24, 100=0.988, 500=0.780, 1000=0.716, 2500=0.654, 5000=0.642, 10000=0.636 (CHF); Marque: Texas Instruments; Fabricant: Texas Instruments; RoHS - Mouser: Y; Minimum Order Quantity: 1; Reeling: True; ComponentLink1URL: http://www.mouser.com/ds/2/405/tca9517-447211.pdf; ComponentLink1Description: http://www.mouser.com/ds/2/405/tca9517-447211.pdf
footprint TCA9517DGKR
pins: 1 VCCA, 2 SCLA, 3 SDAA, 4 GND, 5 EN, 6 SDAB, 7 SCLB, 8 VCCB

## TEN30-2422
designator U?, comment DC/DC 30W
footprint TEN30-2422
pins: 1 UIN+, 2 UIN-, 3 ON/OFF, 4 UOUT+, 5 COM, 6 UOUT-

## TL062IPWR
designator ?, comment Amplificateurs opérationnels - Amplis-Op Dual Low-Noise JFET-Input
MANUFACTURER: Texas Instruments; MANUFACTURER_PART_NUMBER: TL062IPWR; UNIT_PRICE: 0.703; SUPPLIER: mouser; SUPPLIER_PART_NUMBER: 595-TL062IPWR
footprint TSSOP8
pins: 1 O1, 2 -1, 3 +1, 4 V-, 5 +2, 6 -2, 7 O2, 8 V+

## TLC59208
designator U?  Manufacturer Part Number 1: TLC59208FIPWR
Manufacturer 1: Texas Instruments; Description 1: Étage pilote pour LED 8B Fast-Mode Pluse I2C-Bus LED Driver; Tension d'entrée: 3 V to 5.5 V; Nombre de sorties: 8 Output; Fréquence de fonctionnement: 1 MHz; Courant de sortie: 50 mA; Type de sortie: Open Drain; Package/Boîte: TSSOP-16; Conditionnement: Reel; Produit: LED Drivers; Série: TLC59208F; Style de montage: SMD/SMT; Dissipation de la puissance: 0.9 W; Température de fonctionnement max.: + 85 C; Courant d'alimentation max.: 8 mA; Température de fonctionnement min.: - 40 C; Catégorie du produit: Drivers- LED Drivers; Quantité standard du lot: 2000; Supplier 1: Mouser; Supplier Part Number 1: 595-TLC59208FIPWR; RoHS: RoHS Compliant; Category: Étage pilote pour LED; Stock 1: 2752; Pricing 1: 1=1.77, 10=1.60, 25=1.39, 50=1.30, 100=1.28, 250=1.14, 500=0.969, 750=0.878, 1000=0.715, 2000=0.715 (CHF); Type: LED Driver; Marque: Texas Instruments; Fabricant: Texas Instruments; RoHS - Mouser: Y; Minimum Order Quantity: 1; Reeling: True; ComponentLink1URL: http://www.mouser.com/ds/2/405/tlc59208f-407836.pdf; ComponentLink1Description: http://www.mouser.com/ds/2/405/tlc59208f-407836.pdf
footprint R-PDSO-G16
pins: 1 A0, 2 A1, 3 A2, 4 OUT0, 5 OUT1, 6 OUT2, 7 OUT3, 8 GND, 9 OUT4, 10 OUT5, 11 OUT6, 12 OUT7, 13 RESET, 14 SCL, 15 SDA, 16 VCC

## TLV1171
designator ?, comment 1-A, Positive Fixed-Voltage, Low-Dropout Regulator
MANUFACTURER: Texas Instruments; MANUFACTURER_PART_NUMBER: TLV117118DCYT; UNIT_PRICE: 0.745; SUPPLIER: mouser; SUPPLIER_PART_NUMBER: 595-TLV117118DCYT
footprint SOT223
pins: 1 VIN, 2, 4 GND, 3 VOUT
